# Altium footprint library klp.PcbLib: 436 footprints (part 3 of 28)
Each footprint in its own frame and in the unit in brackets; x right, y up, seen from the top. Pads: shape width x height; smd on the part's side, far side on the other; paste and mask are expansions set on the pad; w line width, h text height; cw(c..) or ccw(c..) is an arc to the next point about the centre after c.
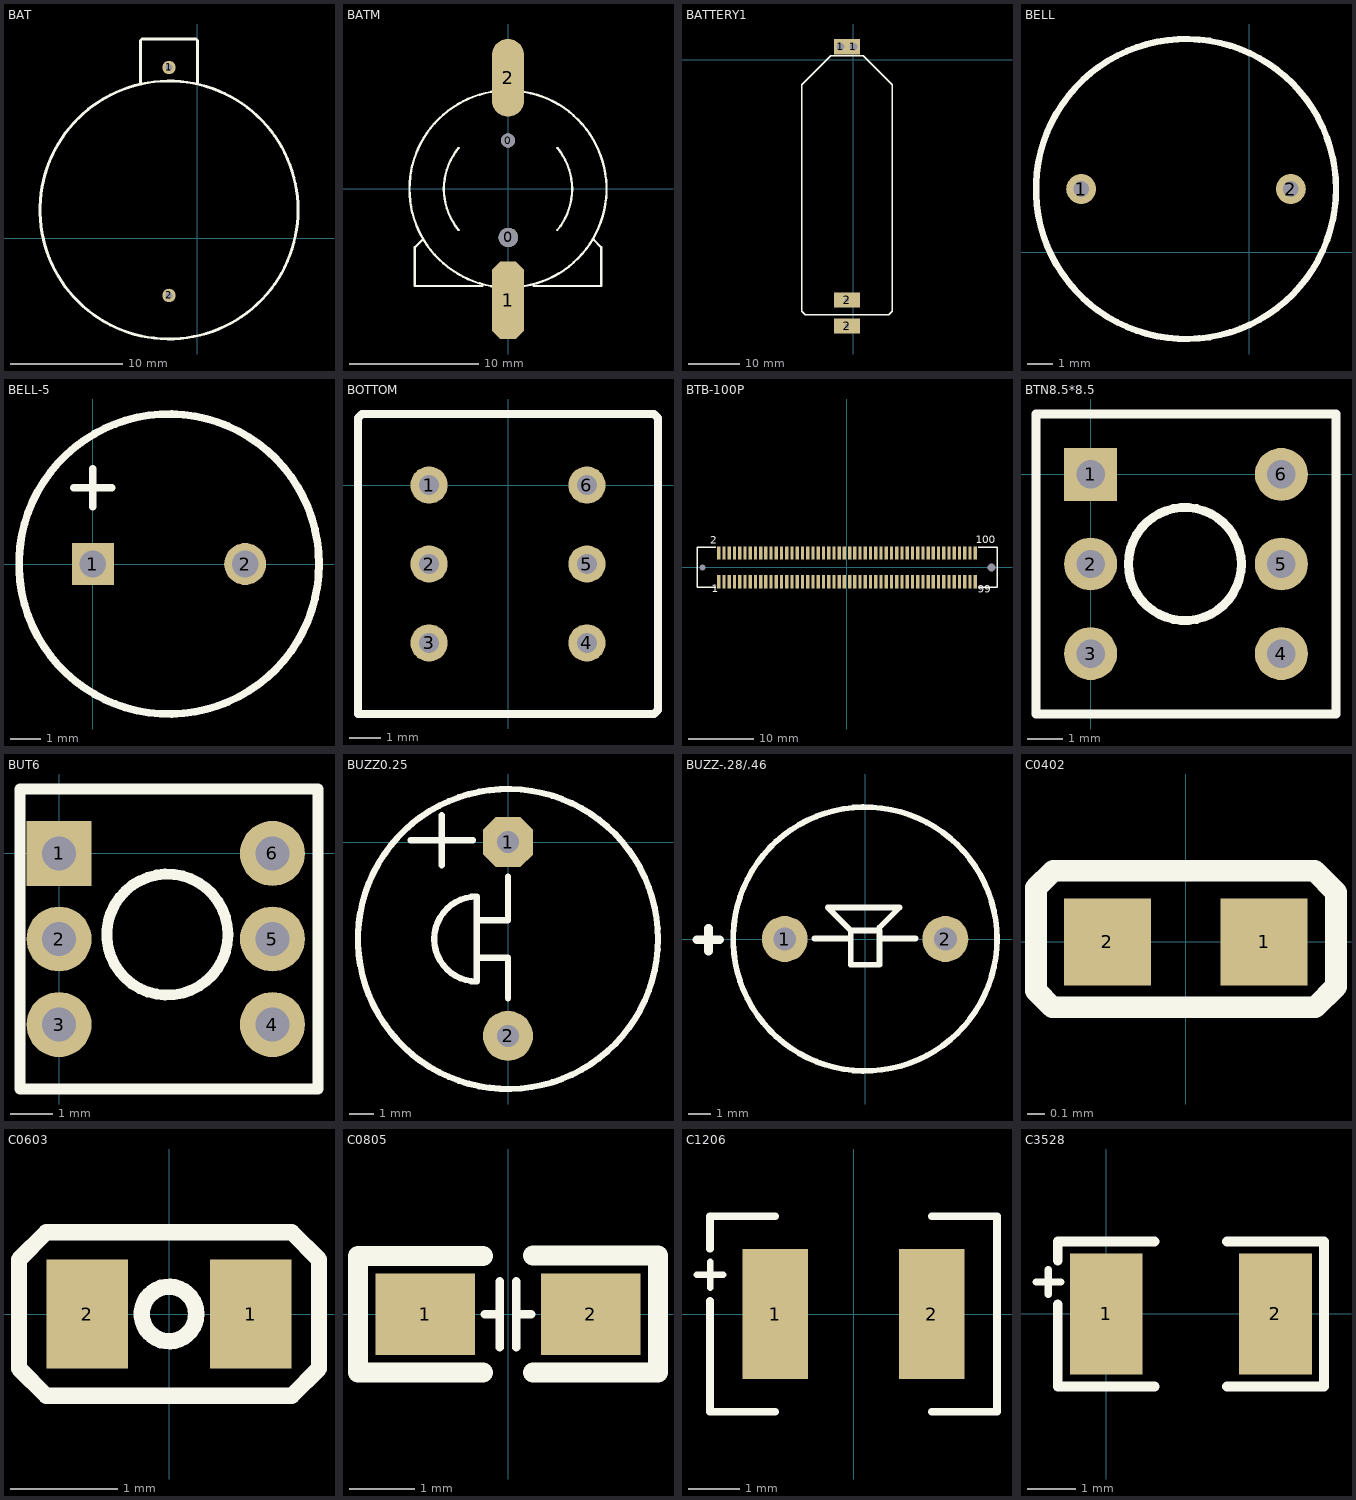
[diagram p2: the footprints below, top view; thin cyan lines are the x and y axes]

## BAT [mm] "BATTERY"
pads (2):
  round 1.2 hole 0.635: 1(-2.54,15.24) 2(-2.54,-5.08)
Top Overlay:
  circle w0.254: c-2.54,2.54 r11.5
  lines w0.254: -5.08,13.843 -5.08,17.653 -4.953,17.78 -0.127,17.78 0,17.653 0,13.843

## BATM [mm] "BAT"
height 7
pads (4):
  round 1.1 hole 1.1 unplated: 0(0,3.748)
  round 1.5 hole 1.5 unplated: 0(0.025,-3.752)
  oct 2.5x6 smd: 1(0,-8.602)
  oval 2.5x6 smd: 2(0,8.598)
Top Overlay:
  lines w0.178: -6.6,-3.902 -7.2,-4.502 -7.2,-7.502 -2,-7.502 ; -3.815,-3.171 cw(c0,-0.002) -3.812,3.171 ; -0.833,-7.576 cw(c0,-0.002) -7.62,-0.002 cw(c0,-0.002) -0.833,7.573 ; 0.833,-7.576 ccw(c0,-0.002) 0.833,7.573 ; 2,-7.502 7.2,-7.502 7.2,-4.502 6.625,-3.927 ; 3.81,-3.177 ccw(c0,-0.002) 3.812,3.171

## BATTERY1 [mm] "18mm*49.5mm"
height 20
pads (4):
  rect 2.54x3 hole 1.5: 1(-2.54,2.54) 1(0,2.54)
  rect 5.08x3 hole 0.7: 2(-1.27,-52.07) 2(-1.27,-46.99)
Top Overlay:
  lines w0.254: -10.16,-46.736 -10.16,-44.577 -10.16,-6.604 -10.16,-4.953 -4.445,0.762 1.905,0.762 7.62,-4.953 7.62,-44.323 7.62,-49.149 6.858,-49.911 -9.398,-49.911 -10.16,-49.149 -10.16,-46.609

## BELL [mm] "BELL"
height 10
pads (2):
  round 1.2 hole 0.635: 1(-6.731,2.54) 2(1.651,2.54)
Top Overlay:
  circle w0.254: c-2.54,2.54 r6

## BELL-5 [mil] "PIN:5MM,SIZE:10MM"
height 118.11
pads (2):
  rect 55x55 hole 35: 1(0,0)
  round 55 hole 35: 2(200,0)
Top Overlay:
  circle w10: c100,0 r196.85
  lines w10: -25,100 25,100 ; 0,75 0,125

## BOTTOM [mm]
height 20
pads (6):
  round 1.2 hole 0.635: 1(-2.54,0) 2(-2.54,-2.54) 3(-2.54,-5.08) 4(2.54,-5.08) 5(2.54,-2.54) 6(2.54,0)
Top Overlay:
  lines w0.254: -4.826,-7.366 4.699,-7.366 4.826,-7.239 4.826,2.159 4.699,2.286 -2.032,2.286 -4.699,2.286 -4.826,2.159 -4.826,-7.366

## BTB-100P [mm] "0.8mm间距"
pads (102):
  rect 0.5x2 smd: 1(-19.6,-2.2) 2(-19.6,2.2) 3(-18.8,-2.2) 4(-18.8,2.2) 5(-18,-2.2) 6(-18,2.2) 7(-17.2,-2.2) 8(-17.2,2.2) 9(-16.4,-2.2) 10(-16.4,2.2) 11(-15.6,-2.2) 12(-15.6,2.2) 13(-14.8,-2.2) 14(-14.8,2.2) 15(-14,-2.2) 16(-14,2.2) 17(-13.2,-2.2) 18(-13.2,2.2) 19(-12.4,-2.2) 20(-12.4,2.2) 21(-11.6,-2.2) 22(-11.6,2.2) 23(-10.8,-2.2) 24(-10.8,2.2) 25(-10,-2.2) 26(-10,2.2) 27(-9.2,-2.2) 28(-9.2,2.2) 29(-8.4,-2.2) 30(-8.4,2.2) 31(-7.6,-2.2) 32(-7.6,2.2) 33(-6.8,-2.2) 34(-6.8,2.2) 35(-6,-2.2) 36(-6,2.2) 37(-5.2,-2.2) 38(-5.2,2.2) 39(-4.4,-2.2) 40(-4.4,2.2) 41(-3.6,-2.2) 42(-3.6,2.2) 43(-2.8,-2.2) 44(-2.8,2.2) 45(-2,-2.2) 46(-2,2.2) 47(-1.2,-2.2) 48(-1.2,2.2) 49(-0.4,-2.2) 50(-0.4,2.2) 51(0.4,-2.2) 52(0.4,2.2) 53(1.2,-2.2) 54(1.2,2.2) 55(2,-2.2) 56(2,2.2) 57(2.8,-2.2) 58(2.8,2.2) 59(3.6,-2.2) 60(3.6,2.2) 61(4.4,-2.2) 62(4.4,2.2) 63(5.2,-2.2) 64(5.2,2.2) 65(6,-2.2) 66(6,2.2) 67(6.8,-2.2) 68(6.8,2.2) 69(7.6,-2.2) 70(7.6,2.2) 71(8.4,-2.2) 72(8.4,2.2) 73(9.2,-2.2) 74(9.2,2.2) 75(10,-2.2) 76(10,2.2) 77(10.8,-2.2) 78(10.8,2.2) 79(11.6,-2.2) 80(11.6,2.2) 81(12.4,-2.2) 82(12.4,2.2) 83(13.2,-2.2) 84(13.2,2.2) 85(14,-2.2) 86(14,2.2) 87(14.8,-2.2) 88(14.8,2.2) 89(15.6,-2.2) 90(15.6,2.2) 91(16.4,-2.2) 92(16.4,2.2) 93(17.2,-2.2) 94(17.2,2.2) 95(18,-2.2) 96(18,2.2) 97(18.8,-2.2) 98(18.8,2.2) 99(19.6,-2.2) 100(19.6,2.2)
  round 0 hole 0.9: ""(-22.1,0)
  round 0 hole 1.25: ""(22.1,0)
Top Overlay:
  lines w0.2: -20.05,3.075 -22.925,3.075 -22.925,-3.075 -20.025,-3.075 ; 20.05,-3.075 22.925,-3.075 22.925,3.075 20.05,3.075
  text "99" at 19.95,-4.25 h2
  text "100" at 19.675,3.275 h2
  text "2" at -20.9,3.225 h2
  text "1" at -20.675,-4.225 h2
3D body "BTB100P.stp": height 4.75, standoff -0.6, extent -22.9,-3.025 22.9,2.975

## BTN8.5*8.5 [mm]
pads (6):
  rect 1.5x1.5 hole 0.8: 1(0,0)
  round 1.5 hole 0.8: 2(0,-2.54) 3(0,-5.08) 4(5.4,-5.08) 5(5.4,-2.54) 6(5.4,0)
Top Overlay:
  circle w0.254: c2.667,-2.54 r1.6
  lines w0.254: -1.55,-6.79 6.95,-6.79 6.95,1.71 -1.55,1.71 -1.55,-6.79

## BUT6 [mil] "7mm*7mm"
height 393.7
pads (6):
  rect 60x60 hole 31.5: 1(0,-0.06)
  round 60 hole 31.5: 2(0,-79.06) 3(0,-158.06) 4(197,-158.06) 5(197,-79.06) 6(197,-0.06)
Top Overlay:
  circle w10: c100,-75 r55.9
  lines w10: -36,-217.56 -36,59.44 239,59.44 239,-217.56 -36,-217.56

## BUZZ0.25 [mil]
pads (2):
  oct 80x80 hole 35.43: 1(0,0)
  round 80 hole 35.43: 2(0,-310)
Top Overlay:
  circle w10: c0,-155 r240
  lines w10: -156,3 -56,3 ; -106,-37 -106,43 ; -50,-185 0,-185 0,-250 ; -50,-125 0,-125 0,-55 ; -50,-223.01 cw(c-50,-155) -50,-86.99 -50,-223.01

## BUZZ-.28/.46 [mil]
pads (2):
  round 80 hole 40: 1(-140,0) 2(140,0)
Top Overlay:
  circle w10: c0,0 r230
  lines w10: -88,1 -25,1 ; 25,1 88,1 ; 25,19.94 60,54.94 -65,54.94 -25,14.94 ; -25,14.94 -25,-45.06 25,-45.06 25,14.94 -25,14.94
  lines w15: -293,-1 -253,-1 ; -273,-21 -273,19
3D body "User Library-WST-1203UX.STEP": height 379.92, standoff -177.17, extent -365.47,-236.22 242.96,236.22

## C0402 [mil]
pads (2):
  rect 20x20 smd: 1(18,0) 2(-18,0)
Top Overlay:
  lines w5: -34.41,-11.22 -34.41,12.4 -30.47,16.34 29.57,16.34 34.49,11.42 34.49,-10.24 29.72,-15 -30.63,-15 -34.41,-11.22
3D body "C0402.step": height 19.68, standoff 0, extent -20.67,-9.84 18.71,9.85

## C0603 [mil]
pads (2):
  rect 30x40 smd: 1(30,0) 2(-30,0)
Top Overlay:
  circle w6: c0,0 r10
  lines w6: -55,-20 -45,-30 45,-30 55,-20 55,20 45,30 -45,30 -55,20 -55,-20
3D body "C0603.step": height 31.1, standoff -0.39, extent -29.53,-13.78 33.46,17.71

## C0805 [mm]
pads (2):
  rect 1.524x1.25 smd: 1(-1.27,0) 2(1.27,0)
Top Overlay:
  lines w0.127: -0.356,0 -0.127,0 ; -0.127,-0.508 -0.127,0.508 ; 0.127,-0.508 0.127,0.508 ; 0.127,0 0.356,0
  lines w0.305: -0.381,-0.891 -2.3,-0.891 -2.3,0.891 -0.381,0.891 ; 0.381,-0.891 2.3,-0.891 2.3,0.9 0.381,0.9
3D body "C0805.step": height 0.6, standoff 0, extent -1,-0.625 1,0.625

## C1206 [mil] "C1206"
height 1
pads (2):
  rect 50x100 smd: 1(-60,0) 2(60,0)
Top Overlay:
  lines w5: -120,30 -100,30 ; -110,20 -110,40
  lines w6: -110,10 -110,-75 -60,-75 ; -110,50 -110,75 ; -100,75 -110,75 ; -60,75 -110,75 ; 60,-75 110,-75 110,75 60,75

## C3528 [mm]
pads (2):
  rect 1.5x2.5 smd: 1(0,0) 2(3.5,0)
Top Overlay:
  lines w0.152: -1.448,0.662 -0.94,0.662 ; -1.194,0.408 -1.194,0.916
  lines w0.203: -1,0.2 -1,-1.5 1.005,-1.5 ; -1,1.1 -1,1.5 1,1.5 ; 2.5,-1.5 4.5,-1.5 4.5,1.5 2.5,1.5